# Altium schematic symbol library Regulator_Linear.SchLib: 1538 symbols (part 6 of 9)
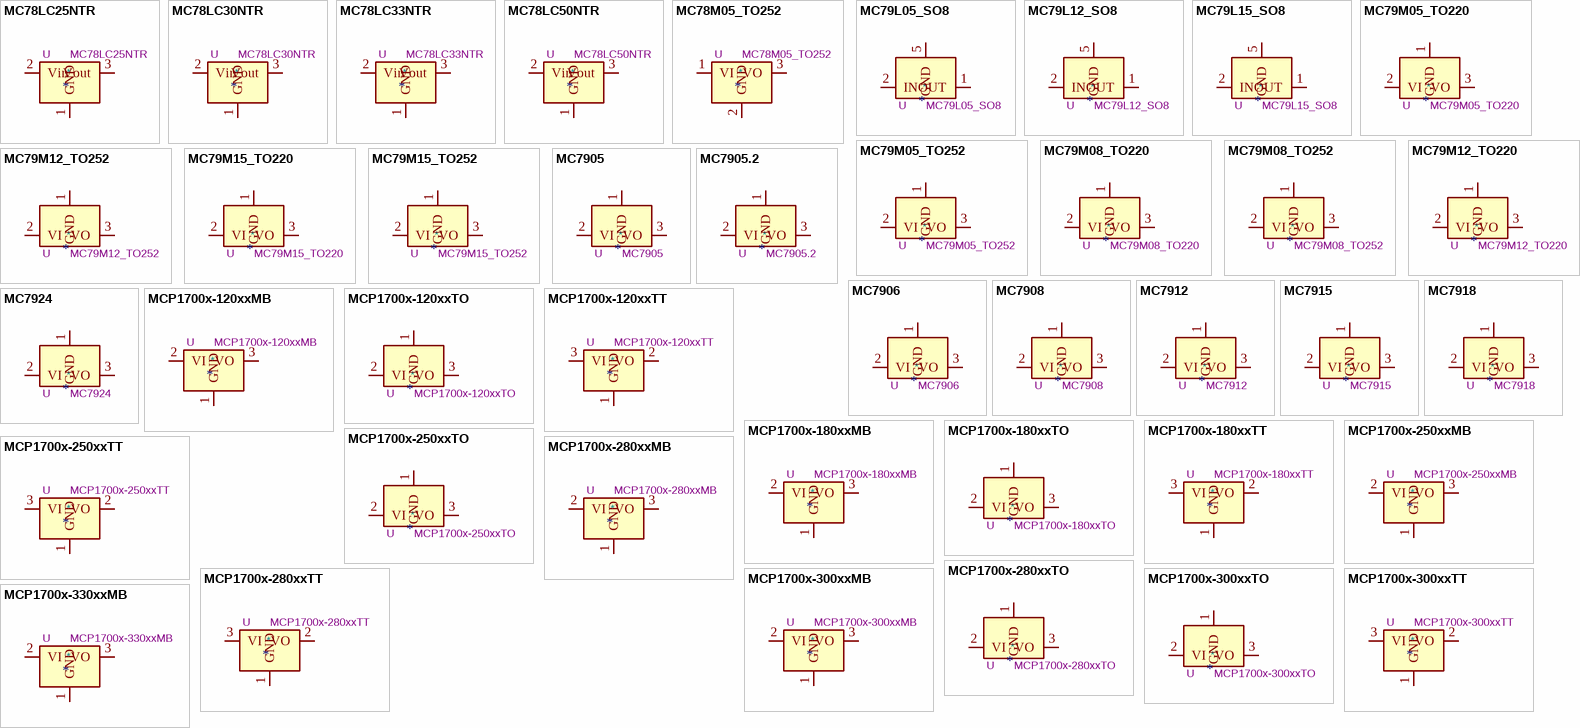
[diagram p43: symbols MC78LC25NTR to MCP1700x-330xxMB]

## MC79M15_TO220
designator *  value MC79M15_TO220  Reference: U
ki_keywords: Voltage Regulator 500mA Negative; ki_description: Negative 500mA 35V Linear Regulator, Fixed Output -15V, TO-220; ki_fp_filters: TO?220*; Footprint: Package_TO_SOT_THT:TO-220-3_Vertical; Datasheet: http://www.onsemi.com/pub/Collateral/MC79M00-D.PDF
pins: 1 GND, 2 VI, 3 VO

## MC79M15_TO252
designator *  value MC79M15_TO252  Reference: U
ki_keywords: Voltage Regulator 500mA Negative; ki_description: Negative 500mA 35V Linear Regulator, Fixed Output -15V, TO-252; ki_fp_filters: TO?252*; Footprint: Package_TO_SOT_SMD:TO-252-2; Datasheet: http://www.onsemi.com/pub/Collateral/MC79M00-D.PDF
pins: 1 GND, 2 VI, 3 VO

## MC7905
designator *  value MC7905  Reference: U
ki_keywords: Voltage Regulator 1.5A Negative; ki_description: Negative 1A 35V Linear Regulator, Fixed Output -5V, TO-220/TO-263; ki_fp_filters: TO?220* TO?263*; Datasheet: http://www.onsemi.com/pub/Collateral/MC7900-D.PDF
pins: 1 GND, 2 VI, 3 VO

## MC7905.2
designator *  value MC7905.2  Reference: U
ki_keywords: Voltage Regulator 1.5A Negative; ki_description: Negative 1A 35V Linear Regulator, Fixed Output -5.2V, TO-220/TO-263; ki_fp_filters: TO?220* TO?263*; Datasheet: http://www.onsemi.com/pub/Collateral/MC7900-D.PDF
pins: 1 GND, 2 VI, 3 VO

## MC7906
designator *  value MC7906  Reference: U
ki_keywords: Voltage Regulator 1.5A Negative; ki_description: Negative 1A 35V Linear Regulator, Fixed Output -6V, TO-220/TO-263; ki_fp_filters: TO?220* TO?263*; Datasheet: http://www.onsemi.com/pub/Collateral/MC7900-D.PDF
pins: 1 GND, 2 VI, 3 VO

## MC7908
designator *  value MC7908  Reference: U
ki_keywords: Voltage Regulator 1.5A Negative; ki_description: Negative 1A 35V Linear Regulator, Fixed Output -8V, TO-220/TO-263; ki_fp_filters: TO?220* TO?263*; Datasheet: http://www.onsemi.com/pub/Collateral/MC7900-D.PDF
pins: 1 GND, 2 VI, 3 VO

## MC7912
designator *  value MC7912  Reference: U
ki_keywords: Voltage Regulator 1.5A Negative; ki_description: Negative 1A 35V Linear Regulator, Fixed Output -12V, TO-220/TO-263; ki_fp_filters: TO?220* TO?263*; Datasheet: http://www.onsemi.com/pub/Collateral/MC7900-D.PDF
pins: 1 GND, 2 VI, 3 VO

## MC7915
designator *  value MC7915  Reference: U
ki_keywords: Voltage Regulator 1.5A Negative; ki_description: Negative 1A 35V Linear Regulator, Fixed Output -15V, TO-220/TO-263; ki_fp_filters: TO?220* TO?263*; Datasheet: http://www.onsemi.com/pub/Collateral/MC7900-D.PDF
pins: 1 GND, 2 VI, 3 VO

## MC7918
designator *  value MC7918  Reference: U
ki_keywords: Voltage Regulator 1.5A Negative; ki_description: Negative 1A 35V Linear Regulator, Fixed Output -18V, TO-220/TO-263; ki_fp_filters: TO?220* TO?263*; Datasheet: http://www.onsemi.com/pub/Collateral/MC7900-D.PDF
pins: 1 GND, 2 VI, 3 VO

## MC7924
designator *  value MC7924  Reference: U
ki_keywords: Voltage Regulator 1.5A Negative; ki_description: Negative 1A 40V Linear Regulator, Fixed Output -24V, TO-220/TO-263; ki_fp_filters: TO?220* TO?263*; Datasheet: http://www.onsemi.com/pub/Collateral/MC7900-D.PDF
pins: 1 GND, 2 VI, 3 VO

## MCP1700x-120xxMB
designator *  value MCP1700x-120xxMB  Reference: U
ki_keywords: regulator linear ldo; ki_description: 250mA Low Quiscent Current LDO, 1.2V output, SOT-89; ki_fp_filters: SOT?89*; Footprint: Package_TO_SOT_SMD:SOT-89-3; Datasheet: http://ww1.microchip.com/downloads/en/DeviceDoc/20001826D.pdf
pins: 1 GND, 2 VI, 3 VO

## MCP1700x-120xxTO
designator *  value MCP1700x-120xxTO  Reference: U
ki_keywords: regulator linear ldo; ki_description: 250mA Low Quiscent Current LDO, 1.2V output, TO-92; ki_fp_filters: TO?92*; Footprint: Package_TO_SOT_THT:TO-92_Inline; Datasheet: http://ww1.microchip.com/downloads/en/DeviceDoc/20001826D.pdf
pins: 1 GND, 2 VI, 3 VO

## MCP1700x-120xxTT
designator *  value MCP1700x-120xxTT  Reference: U
ki_keywords: regulator linear ldo; ki_description: 250mA Low Quiscent Current LDO, 1.2V output, SOT-23; ki_fp_filters: SOT?23*; Footprint: Package_TO_SOT_SMD:SOT-23; Datasheet: http://ww1.microchip.com/downloads/en/DeviceDoc/20001826D.pdf
pins: 1 GND, 2 VO, 3 VI

## MCP1700x-180xxMB
designator *  value MCP1700x-180xxMB  Reference: U
ki_keywords: regulator linear ldo; ki_description: 250mA Low Quiscent Current LDO, 1.8V output, SOT-89; ki_fp_filters: SOT?89*; Footprint: Package_TO_SOT_SMD:SOT-89-3; Datasheet: http://ww1.microchip.com/downloads/en/DeviceDoc/20001826D.pdf
pins: 1 GND, 2 VI, 3 VO

## MCP1700x-180xxTO
designator *  value MCP1700x-180xxTO  Reference: U
ki_keywords: regulator linear ldo; ki_description: 250mA Low Quiscent Current LDO, 1.8V output, TO-92; ki_fp_filters: TO?92*; Footprint: Package_TO_SOT_THT:TO-92_Inline; Datasheet: http://ww1.microchip.com/downloads/en/DeviceDoc/20001826D.pdf
pins: 1 GND, 2 VI, 3 VO

## MCP1700x-180xxTT
designator *  value MCP1700x-180xxTT  Reference: U
ki_keywords: regulator linear ldo; ki_description: 250mA Low Quiscent Current LDO, 1.8V output, SOT-23; ki_fp_filters: SOT?23*; Footprint: Package_TO_SOT_SMD:SOT-23; Datasheet: http://ww1.microchip.com/downloads/en/DeviceDoc/20001826D.pdf
pins: 1 GND, 2 VO, 3 VI

## MCP1700x-250xxMB
designator *  value MCP1700x-250xxMB  Reference: U
ki_keywords: regulator linear ldo; ki_description: 250mA Low Quiscent Current LDO, 2.5V output, SOT-89; ki_fp_filters: SOT?89*; Footprint: Package_TO_SOT_SMD:SOT-89-3; Datasheet: http://ww1.microchip.com/downloads/en/DeviceDoc/20001826D.pdf
pins: 1 GND, 2 VI, 3 VO

## MCP1700x-250xxTO
designator *  value MCP1700x-250xxTO  Reference: U
ki_keywords: regulator linear ldo; ki_description: 250mA Low Quiscent Current LDO, 2.5V output, TO-92; ki_fp_filters: TO?92*; Footprint: Package_TO_SOT_THT:TO-92_Inline; Datasheet: http://ww1.microchip.com/downloads/en/DeviceDoc/20001826D.pdf
pins: 1 GND, 2 VI, 3 VO

## MCP1700x-250xxTT
designator *  value MCP1700x-250xxTT  Reference: U
ki_keywords: regulator linear ldo; ki_description: 250mA Low Quiscent Current LDO, 2.5V output, SOT-23; ki_fp_filters: SOT?23*; Footprint: Package_TO_SOT_SMD:SOT-23; Datasheet: http://ww1.microchip.com/downloads/en/DeviceDoc/20001826D.pdf
pins: 1 GND, 2 VO, 3 VI

## MCP1700x-280xxMB
designator *  value MCP1700x-280xxMB  Reference: U
ki_keywords: regulator linear ldo; ki_description: 250mA Low Quiscent Current LDO, 2.8V output, SOT-89; ki_fp_filters: SOT?89*; Footprint: Package_TO_SOT_SMD:SOT-89-3; Datasheet: http://ww1.microchip.com/downloads/en/DeviceDoc/20001826D.pdf
pins: 1 GND, 2 VI, 3 VO

## MCP1700x-280xxTO
designator *  value MCP1700x-280xxTO  Reference: U
ki_keywords: regulator linear ldo; ki_description: 250mA Low Quiscent Current LDO, 2.8V output, TO-92; ki_fp_filters: TO?92*; Footprint: Package_TO_SOT_THT:TO-92_Inline; Datasheet: http://ww1.microchip.com/downloads/en/DeviceDoc/20001826D.pdf
pins: 1 GND, 2 VI, 3 VO

## MCP1700x-280xxTT
designator *  value MCP1700x-280xxTT  Reference: U
ki_keywords: regulator linear ldo; ki_description: 250mA Low Quiscent Current LDO, 2.8V output, SOT-23; ki_fp_filters: SOT?23*; Footprint: Package_TO_SOT_SMD:SOT-23; Datasheet: http://ww1.microchip.com/downloads/en/DeviceDoc/20001826D.pdf
pins: 1 GND, 2 VO, 3 VI

## MCP1700x-300xxMB
designator *  value MCP1700x-300xxMB  Reference: U
ki_keywords: regulator linear ldo; ki_description: 250mA Low Quiscent Current LDO, 3.0V output, SOT-89; ki_fp_filters: SOT?89*; Footprint: Package_TO_SOT_SMD:SOT-89-3; Datasheet: http://ww1.microchip.com/downloads/en/DeviceDoc/20001826D.pdf
pins: 1 GND, 2 VI, 3 VO

## MCP1700x-300xxTO
designator *  value MCP1700x-300xxTO  Reference: U
ki_keywords: regulator linear ldo; ki_description: 250mA Low Quiscent Current LDO, 3.0V output, TO-92; ki_fp_filters: TO?92*; Footprint: Package_TO_SOT_THT:TO-92_Inline; Datasheet: http://ww1.microchip.com/downloads/en/DeviceDoc/20001826D.pdf
pins: 1 GND, 2 VI, 3 VO

## MCP1700x-300xxTT
designator *  value MCP1700x-300xxTT  Reference: U
ki_keywords: regulator linear ldo; ki_description: 250mA Low Quiscent Current LDO, 3.0V output, SOT-23; ki_fp_filters: SOT?23*; Footprint: Package_TO_SOT_SMD:SOT-23; Datasheet: http://ww1.microchip.com/downloads/en/DeviceDoc/20001826D.pdf
pins: 1 GND, 2 VO, 3 VI

## MCP1700x-330xxMB
designator *  value MCP1700x-330xxMB  Reference: U
ki_keywords: regulator linear ldo; ki_description: 250mA Low Quiscent Current LDO, 3.3V output, SOT-89; ki_fp_filters: SOT?89*; Footprint: Package_TO_SOT_SMD:SOT-89-3; Datasheet: http://ww1.microchip.com/downloads/en/DeviceDoc/20001826D.pdf
pins: 1 GND, 2 VI, 3 VO

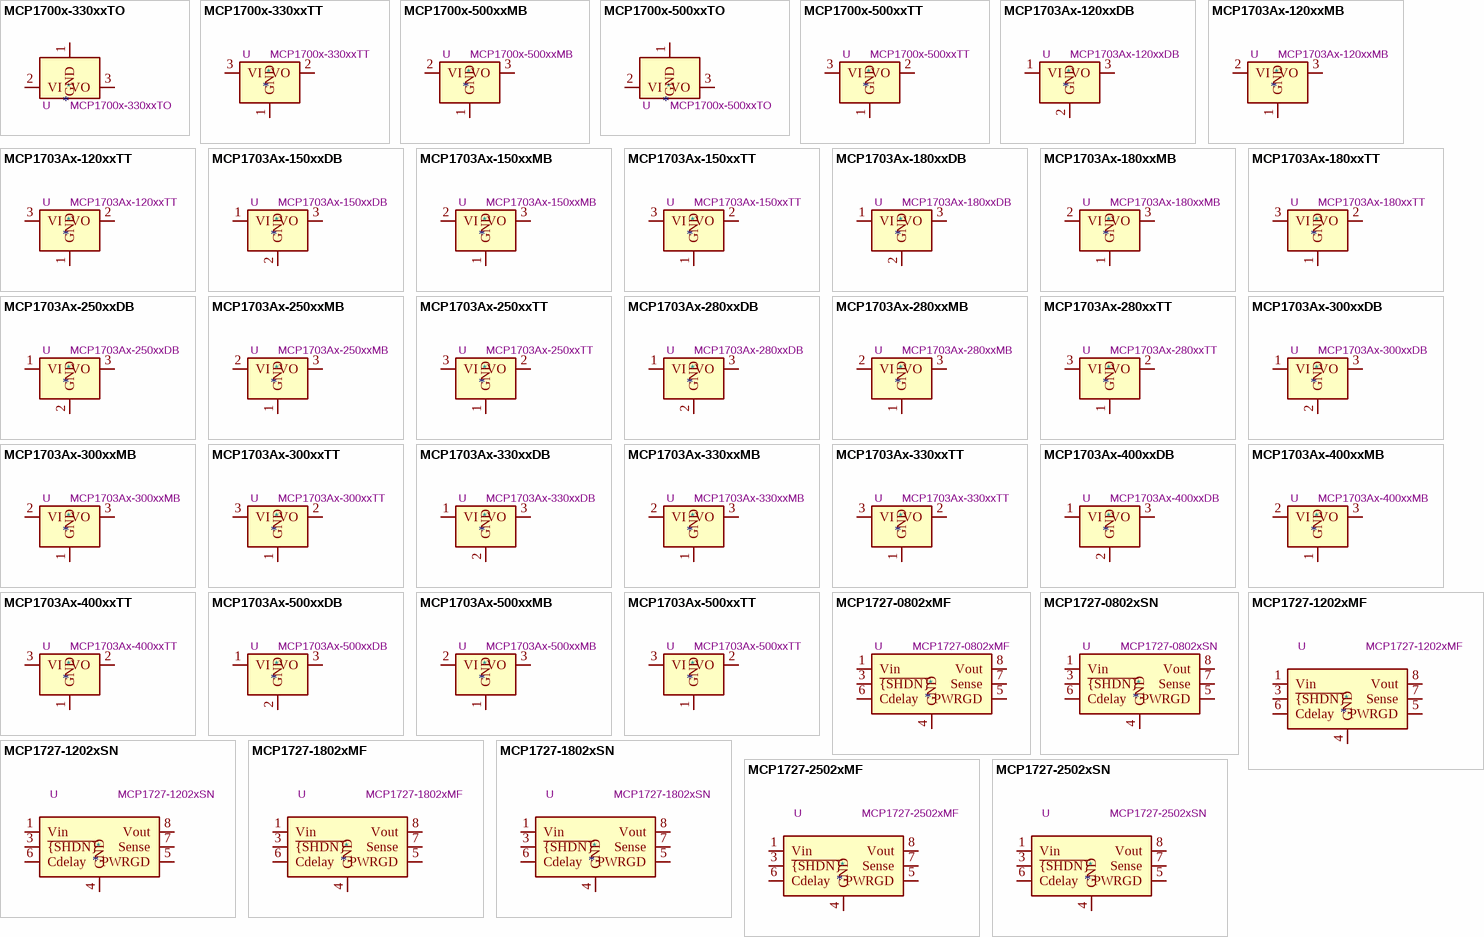
[diagram p23: symbols MCP1700x-330xxTO to MCP1727-2502xSN]

## MCP1700x-330xxTO
designator *  value MCP1700x-330xxTO  Reference: U
ki_keywords: regulator linear ldo; ki_description: 250mA Low Quiscent Current LDO, 3.3V output, TO-92; ki_fp_filters: TO?92*; Footprint: Package_TO_SOT_THT:TO-92_Inline; Datasheet: http://ww1.microchip.com/downloads/en/DeviceDoc/20001826D.pdf
pins: 1 GND, 2 VI, 3 VO

## MCP1700x-330xxTT
designator *  value MCP1700x-330xxTT  Reference: U
ki_keywords: regulator linear ldo; ki_description: 250mA Low Quiscent Current LDO, 3.3V output, SOT-23; ki_fp_filters: SOT?23*; Footprint: Package_TO_SOT_SMD:SOT-23; Datasheet: http://ww1.microchip.com/downloads/en/DeviceDoc/20001826D.pdf
pins: 1 GND, 2 VO, 3 VI

## MCP1700x-500xxMB
designator *  value MCP1700x-500xxMB  Reference: U
ki_keywords: regulator linear ldo; ki_description: 250mA Low Quiscent Current LDO, 5.0V output, SOT-89; ki_fp_filters: SOT?89*; Footprint: Package_TO_SOT_SMD:SOT-89-3; Datasheet: http://ww1.microchip.com/downloads/en/DeviceDoc/20001826D.pdf
pins: 1 GND, 2 VI, 3 VO

## MCP1700x-500xxTO
designator *  value MCP1700x-500xxTO  Reference: U
ki_keywords: regulator linear ldo; ki_description: 250mA Low Quiscent Current LDO, 5.0V output, TO-92; ki_fp_filters: TO?92*; Footprint: Package_TO_SOT_THT:TO-92_Inline; Datasheet: http://ww1.microchip.com/downloads/en/DeviceDoc/20001826D.pdf
pins: 1 GND, 2 VI, 3 VO

## MCP1700x-500xxTT
designator *  value MCP1700x-500xxTT  Reference: U
ki_keywords: regulator linear ldo; ki_description: 250mA Low Quiscent Current LDO, 5.0V output, SOT-23; ki_fp_filters: SOT?23*; Footprint: Package_TO_SOT_SMD:SOT-23; Datasheet: http://ww1.microchip.com/downloads/en/DeviceDoc/20001826D.pdf
pins: 1 GND, 2 VO, 3 VI

## MCP1703Ax-120xxDB
designator *  value MCP1703Ax-120xxDB  Reference: U
ki_keywords: REGULATOR LDO; ki_description: Low Quiescent Current LDO Regulator, 1.2V, 250mA, Vin<=16V, SOT-223; ki_fp_filters: SOT?223*TabPin2*; Footprint: Package_TO_SOT_SMD:SOT-223-3_TabPin2; Datasheet: http://ww1.microchip.com/downloads/en/DeviceDoc/20005122B.pdf
pins: 1 VI, 2 GND, 3 VO

## MCP1703Ax-120xxMB
designator *  value MCP1703Ax-120xxMB  Reference: U
ki_keywords: REGULATOR LDO; ki_description: Low Quiescent Current LDO Regulator, 1.2V, 250mA, Vin<=16V, SOT-89; ki_fp_filters: SOT?89*; Footprint: Package_TO_SOT_SMD:SOT-89-3; Datasheet: http://ww1.microchip.com/downloads/en/DeviceDoc/20005122B.pdf
pins: 1 GND, 2 VI, 3 VO

## MCP1703Ax-120xxTT
designator *  value MCP1703Ax-120xxTT  Reference: U
ki_keywords: REGULATOR LDO; ki_description: Low Quiescent Current LDO Regulator, 1.2V, 250mA, Vin<=16V, SOT-23; ki_fp_filters: SOT?23*; Footprint: Package_TO_SOT_SMD:SOT-23; Datasheet: http://ww1.microchip.com/downloads/en/DeviceDoc/20005122B.pdf
pins: 1 GND, 2 VO, 3 VI

## MCP1703Ax-150xxDB
designator *  value MCP1703Ax-150xxDB  Reference: U
ki_keywords: REGULATOR LDO; ki_description: Low Quiescent Current LDO Regulator, 1.5V, 250mA, Vin<=16V, SOT-223; ki_fp_filters: SOT?223*TabPin2*; Footprint: Package_TO_SOT_SMD:SOT-223-3_TabPin2; Datasheet: http://ww1.microchip.com/downloads/en/DeviceDoc/20005122B.pdf
pins: 1 VI, 2 GND, 3 VO

## MCP1703Ax-150xxMB
designator *  value MCP1703Ax-150xxMB  Reference: U
ki_keywords: REGULATOR LDO; ki_description: Low Quiescent Current LDO Regulator, 1.5V, 250mA, Vin<=16V, SOT-89; ki_fp_filters: SOT?89*; Footprint: Package_TO_SOT_SMD:SOT-89-3; Datasheet: http://ww1.microchip.com/downloads/en/DeviceDoc/20005122B.pdf
pins: 1 GND, 2 VI, 3 VO

## MCP1703Ax-150xxTT
designator *  value MCP1703Ax-150xxTT  Reference: U
ki_keywords: REGULATOR LDO; ki_description: Low Quiescent Current LDO Regulator, 1.5V, 250mA, Vin<=16V, SOT-23; ki_fp_filters: SOT?23*; Footprint: Package_TO_SOT_SMD:SOT-23; Datasheet: http://ww1.microchip.com/downloads/en/DeviceDoc/20005122B.pdf
pins: 1 GND, 2 VO, 3 VI

## MCP1703Ax-180xxDB
designator *  value MCP1703Ax-180xxDB  Reference: U
ki_keywords: REGULATOR LDO; ki_description: Low Quiescent Current LDO Regulator, 1.8V, 250mA, Vin<=16V, SOT-223; ki_fp_filters: SOT?223*TabPin2*; Footprint: Package_TO_SOT_SMD:SOT-223-3_TabPin2; Datasheet: http://ww1.microchip.com/downloads/en/DeviceDoc/20005122B.pdf
pins: 1 VI, 2 GND, 3 VO

## MCP1703Ax-180xxMB
designator *  value MCP1703Ax-180xxMB  Reference: U
ki_keywords: REGULATOR LDO; ki_description: Low Quiescent Current LDO Regulator, 1.8V, 250mA, Vin<=16V, SOT-89; ki_fp_filters: SOT?89*; Footprint: Package_TO_SOT_SMD:SOT-89-3; Datasheet: http://ww1.microchip.com/downloads/en/DeviceDoc/20005122B.pdf
pins: 1 GND, 2 VI, 3 VO

## MCP1703Ax-180xxTT
designator *  value MCP1703Ax-180xxTT  Reference: U
ki_keywords: REGULATOR LDO; ki_description: Low Quiescent Current LDO Regulator, 1.8V, 250mA, Vin<=16V, SOT-23; ki_fp_filters: SOT?23*; Footprint: Package_TO_SOT_SMD:SOT-23; Datasheet: http://ww1.microchip.com/downloads/en/DeviceDoc/20005122B.pdf
pins: 1 GND, 2 VO, 3 VI

## MCP1703Ax-250xxDB
designator *  value MCP1703Ax-250xxDB  Reference: U
ki_keywords: REGULATOR LDO; ki_description: Low Quiescent Current LDO Regulator, 2.5V, 250mA, Vin<=16V, SOT-223; ki_fp_filters: SOT?223*TabPin2*; Footprint: Package_TO_SOT_SMD:SOT-223-3_TabPin2; Datasheet: http://ww1.microchip.com/downloads/en/DeviceDoc/20005122B.pdf
pins: 1 VI, 2 GND, 3 VO

## MCP1703Ax-250xxMB
designator *  value MCP1703Ax-250xxMB  Reference: U
ki_keywords: REGULATOR LDO; ki_description: Low Quiescent Current LDO Regulator, 2.5V, 250mA, Vin<=16V, SOT-89; ki_fp_filters: SOT?89*; Footprint: Package_TO_SOT_SMD:SOT-89-3; Datasheet: http://ww1.microchip.com/downloads/en/DeviceDoc/20005122B.pdf
pins: 1 GND, 2 VI, 3 VO

## MCP1703Ax-250xxTT
designator *  value MCP1703Ax-250xxTT  Reference: U
ki_keywords: REGULATOR LDO; ki_description: Low Quiescent Current LDO Regulator, 2.5V, 250mA, Vin<=16V, SOT-23; ki_fp_filters: SOT?23*; Footprint: Package_TO_SOT_SMD:SOT-23; Datasheet: http://ww1.microchip.com/downloads/en/DeviceDoc/20005122B.pdf
pins: 1 GND, 2 VO, 3 VI

## MCP1703Ax-280xxDB
designator *  value MCP1703Ax-280xxDB  Reference: U
ki_keywords: REGULATOR LDO; ki_description: Low Quiescent Current LDO Regulator, 2.8V, 250mA, Vin<=16V, SOT-223; ki_fp_filters: SOT?223*TabPin2*; Footprint: Package_TO_SOT_SMD:SOT-223-3_TabPin2; Datasheet: http://ww1.microchip.com/downloads/en/DeviceDoc/20005122B.pdf
pins: 1 VI, 2 GND, 3 VO

## MCP1703Ax-280xxMB
designator *  value MCP1703Ax-280xxMB  Reference: U
ki_keywords: REGULATOR LDO; ki_description: Low Quiescent Current LDO Regulator, 2.8V, 250mA, Vin<=16V, SOT-89; ki_fp_filters: SOT?89*; Footprint: Package_TO_SOT_SMD:SOT-89-3; Datasheet: http://ww1.microchip.com/downloads/en/DeviceDoc/20005122B.pdf
pins: 1 GND, 2 VI, 3 VO

## MCP1703Ax-280xxTT
designator *  value MCP1703Ax-280xxTT  Reference: U
ki_keywords: REGULATOR LDO; ki_description: Low Quiescent Current LDO Regulator, 2.8V, 250mA, Vin<=16V, SOT-23; ki_fp_filters: SOT?23*; Footprint: Package_TO_SOT_SMD:SOT-23; Datasheet: http://ww1.microchip.com/downloads/en/DeviceDoc/20005122B.pdf
pins: 1 GND, 2 VO, 3 VI

## MCP1703Ax-300xxDB
designator *  value MCP1703Ax-300xxDB  Reference: U
ki_keywords: REGULATOR LDO; ki_description: Low Quiescent Current LDO Regulator, 3.0V, 250mA, Vin<=16V, SOT-223; ki_fp_filters: SOT?223*TabPin2*; Footprint: Package_TO_SOT_SMD:SOT-223-3_TabPin2; Datasheet: http://ww1.microchip.com/downloads/en/DeviceDoc/20005122B.pdf
pins: 1 VI, 2 GND, 3 VO

## MCP1703Ax-300xxMB
designator *  value MCP1703Ax-300xxMB  Reference: U
ki_keywords: REGULATOR LDO; ki_description: Low Quiescent Current LDO Regulator, 3.0V, 250mA, Vin<=16V, SOT-89; ki_fp_filters: SOT?89*; Footprint: Package_TO_SOT_SMD:SOT-89-3; Datasheet: http://ww1.microchip.com/downloads/en/DeviceDoc/20005122B.pdf
pins: 1 GND, 2 VI, 3 VO

## MCP1703Ax-300xxTT
designator *  value MCP1703Ax-300xxTT  Reference: U
ki_keywords: REGULATOR LDO; ki_description: Low Quiescent Current LDO Regulator, 3.0V, 250mA, Vin<=16V, SOT-23; ki_fp_filters: SOT?23*; Footprint: Package_TO_SOT_SMD:SOT-23; Datasheet: http://ww1.microchip.com/downloads/en/DeviceDoc/20005122B.pdf
pins: 1 GND, 2 VO, 3 VI

## MCP1703Ax-330xxDB
designator *  value MCP1703Ax-330xxDB  Reference: U
ki_keywords: REGULATOR LDO; ki_description: Low Quiescent Current LDO Regulator, 3.3V, 250mA, Vin<=16V, SOT-223; ki_fp_filters: SOT?223*TabPin2*; Footprint: Package_TO_SOT_SMD:SOT-223-3_TabPin2; Datasheet: http://ww1.microchip.com/downloads/en/DeviceDoc/20005122B.pdf
pins: 1 VI, 2 GND, 3 VO

## MCP1703Ax-330xxMB
designator *  value MCP1703Ax-330xxMB  Reference: U
ki_keywords: REGULATOR LDO; ki_description: Low Quiescent Current LDO Regulator, 3.3V, 250mA, Vin<=16V, SOT-89; ki_fp_filters: SOT?89*; Footprint: Package_TO_SOT_SMD:SOT-89-3; Datasheet: http://ww1.microchip.com/downloads/en/DeviceDoc/20005122B.pdf
pins: 1 GND, 2 VI, 3 VO

## MCP1703Ax-330xxTT
designator *  value MCP1703Ax-330xxTT  Reference: U
ki_keywords: REGULATOR LDO; ki_description: Low Quiescent Current LDO Regulator, 3.3V, 250mA, Vin<=16V, SOT-23; ki_fp_filters: SOT?23*; Footprint: Package_TO_SOT_SMD:SOT-23; Datasheet: http://ww1.microchip.com/downloads/en/DeviceDoc/20005122B.pdf
pins: 1 GND, 2 VO, 3 VI

## MCP1703Ax-400xxDB
designator *  value MCP1703Ax-400xxDB  Reference: U
ki_keywords: REGULATOR LDO; ki_description: Low Quiescent Current LDO Regulator, 4.0V, 250mA, Vin<=16V, SOT-223; ki_fp_filters: SOT?223*TabPin2*; Footprint: Package_TO_SOT_SMD:SOT-223-3_TabPin2; Datasheet: http://ww1.microchip.com/downloads/en/DeviceDoc/20005122B.pdf
pins: 1 VI, 2 GND, 3 VO

## MCP1703Ax-400xxMB
designator *  value MCP1703Ax-400xxMB  Reference: U
ki_keywords: REGULATOR LDO; ki_description: Low Quiescent Current LDO Regulator, 4.0V, 250mA, Vin<=16V, SOT-89; ki_fp_filters: SOT?89*; Footprint: Package_TO_SOT_SMD:SOT-89-3; Datasheet: http://ww1.microchip.com/downloads/en/DeviceDoc/20005122B.pdf
pins: 1 GND, 2 VI, 3 VO

## MCP1703Ax-400xxTT
designator *  value MCP1703Ax-400xxTT  Reference: U
ki_keywords: REGULATOR LDO; ki_description: Low Quiescent Current LDO Regulator, 4.0V, 250mA, Vin<=16V, SOT-23; ki_fp_filters: SOT?23*; Footprint: Package_TO_SOT_SMD:SOT-23; Datasheet: http://ww1.microchip.com/downloads/en/DeviceDoc/20005122B.pdf
pins: 1 GND, 2 VO, 3 VI

## MCP1703Ax-500xxDB
designator *  value MCP1703Ax-500xxDB  Reference: U
ki_keywords: REGULATOR LDO; ki_description: Low Quiescent Current LDO Regulator, 5.0V, 250mA, Vin<=16V, SOT-223; ki_fp_filters: SOT?223*TabPin2*; Footprint: Package_TO_SOT_SMD:SOT-223-3_TabPin2; Datasheet: http://ww1.microchip.com/downloads/en/DeviceDoc/20005122B.pdf
pins: 1 VI, 2 GND, 3 VO

## MCP1703Ax-500xxMB
designator *  value MCP1703Ax-500xxMB  Reference: U
ki_keywords: REGULATOR LDO; ki_description: Low Quiescent Current LDO Regulator, 5.0V, 250mA, Vin<=16V, SOT-89; ki_fp_filters: SOT?89*; Footprint: Package_TO_SOT_SMD:SOT-89-3; Datasheet: http://ww1.microchip.com/downloads/en/DeviceDoc/20005122B.pdf
pins: 1 GND, 2 VI, 3 VO

## MCP1703Ax-500xxTT
designator *  value MCP1703Ax-500xxTT  Reference: U
ki_keywords: REGULATOR LDO; ki_description: Low Quiescent Current LDO Regulator, 5.0V, 250mA, Vin<=16V, SOT-23; ki_fp_filters: SOT?23*; Footprint: Package_TO_SOT_SMD:SOT-23; Datasheet: http://ww1.microchip.com/downloads/en/DeviceDoc/20005122B.pdf
pins: 1 GND, 2 VO, 3 VI

## MCP1727-0802xMF
designator *  value MCP1727-0802xMF  Reference: U
ki_keywords: Low Voltage Low Quiescent Current Fixed LDO Regulator; ki_description: 1.5A, Low Voltage, Low Quiescent Current LDO Regulator, 2.3 - 6V Input, Fixed 0.8V Output, 330mV Dropout, DFN-8; ki_fp_filters: DFN*3x3mm*P0.65mm*; Footprint: Package_DFN_QFN:DFN-8-1EP_3x3mm_P0.65mm_EP1.55x2.4mm; Datasheet: https://ww1.microchip.com/downloads/aemtest/APID/ProductDocuments/DataSheets/MCP1727-1.5A-Low-Voltage-Low-Quiescent-Current-LDO-Regulator-20001999D.pdf
pins: 1 Vin, 2 Vin hidden, 3 ~{{SHDN}}, 4 GND, 5 PWRGD, 6 Cdelay, 7 Sense, 8 Vout, 9 GND hidden

## MCP1727-0802xSN
designator *  value MCP1727-0802xSN  Reference: U
ki_keywords: Low Voltage Low Quiescent Current Fixed LDO Regulator; ki_description: 1.5A, Low Voltage, Low Quiescent Current LDO Regulator, 2.3 - 6V Input, Fixed 0.8V Output, 330mV Dropout, SOIC-8; ki_fp_filters: SOIC*3.9x4.9mm*P1.27mm*; Footprint: Package_SO:SOIC-8_3.9x4.9mm_P1.27mm; Datasheet: https://ww1.microchip.com/downloads/aemtest/APID/ProductDocuments/DataSheets/MCP1727-1.5A-Low-Voltage-Low-Quiescent-Current-LDO-Regulator-20001999D.pdf
pins: 1 Vin, 2 Vin hidden, 3 ~{{SHDN}}, 4 GND, 5 PWRGD, 6 Cdelay, 7 Sense, 8 Vout

## MCP1727-1202xMF
designator *  value MCP1727-1202xMF  Reference: U
ki_keywords: Low Voltage Low Quiescent Current Fixed LDO Regulator; ki_description: 1.5A, Low Voltage, Low Quiescent Current LDO Regulator, 2.3 - 6V Input, Fixed 1.2V Output, 330mV Dropout, DFN-8; ki_fp_filters: DFN*3x3mm*P0.65mm*; Footprint: Package_DFN_QFN:DFN-8-1EP_3x3mm_P0.65mm_EP1.55x2.4mm; Datasheet: https://ww1.microchip.com/downloads/aemtest/APID/ProductDocuments/DataSheets/MCP1727-1.5A-Low-Voltage-Low-Quiescent-Current-LDO-Regulator-20001999D.pdf
pins: 1 Vin, 2 Vin hidden, 3 ~{{SHDN}}, 4 GND, 5 PWRGD, 6 Cdelay, 7 Sense, 8 Vout, 9 GND hidden

## MCP1727-1202xSN
designator *  value MCP1727-1202xSN  Reference: U
ki_keywords: Low Voltage Low Quiescent Current Fixed LDO Regulator; ki_description: 1.5A, Low Voltage, Low Quiescent Current LDO Regulator, 2.3 - 6V Input, Fixed 1.2V Output, 330mV Dropout, SOIC-8; ki_fp_filters: SOIC*3.9x4.9mm*P1.27mm*; Footprint: Package_SO:SOIC-8_3.9x4.9mm_P1.27mm; Datasheet: https://ww1.microchip.com/downloads/aemtest/APID/ProductDocuments/DataSheets/MCP1727-1.5A-Low-Voltage-Low-Quiescent-Current-LDO-Regulator-20001999D.pdf
pins: 1 Vin, 2 Vin hidden, 3 ~{{SHDN}}, 4 GND, 5 PWRGD, 6 Cdelay, 7 Sense, 8 Vout

## MCP1727-1802xMF
designator *  value MCP1727-1802xMF  Reference: U
ki_keywords: Low Voltage Low Quiescent Current Fixed LDO Regulator; ki_description: 1.5A, Low Voltage, Low Quiescent Current LDO Regulator, 2.3 - 6V Input, Fixed 1.8V Output, 330mV Dropout, DFN-8; ki_fp_filters: DFN*3x3mm*P0.65mm*; Footprint: Package_DFN_QFN:DFN-8-1EP_3x3mm_P0.65mm_EP1.55x2.4mm; Datasheet: https://ww1.microchip.com/downloads/aemtest/APID/ProductDocuments/DataSheets/MCP1727-1.5A-Low-Voltage-Low-Quiescent-Current-LDO-Regulator-20001999D.pdf
pins: 1 Vin, 2 Vin hidden, 3 ~{{SHDN}}, 4 GND, 5 PWRGD, 6 Cdelay, 7 Sense, 8 Vout, 9 GND hidden

## MCP1727-1802xSN
designator *  value MCP1727-1802xSN  Reference: U
ki_keywords: Low Voltage Low Quiescent Current Fixed LDO Regulator; ki_description: 1.5A, Low Voltage, Low Quiescent Current LDO Regulator, 2.3 - 6V Input, Fixed 1.8V Output, 330mV Dropout, SOIC-8; ki_fp_filters: SOIC*3.9x4.9mm*P1.27mm*; Footprint: Package_SO:SOIC-8_3.9x4.9mm_P1.27mm; Datasheet: https://ww1.microchip.com/downloads/aemtest/APID/ProductDocuments/DataSheets/MCP1727-1.5A-Low-Voltage-Low-Quiescent-Current-LDO-Regulator-20001999D.pdf
pins: 1 Vin, 2 Vin hidden, 3 ~{{SHDN}}, 4 GND, 5 PWRGD, 6 Cdelay, 7 Sense, 8 Vout

## MCP1727-2502xMF
designator *  value MCP1727-2502xMF  Reference: U
ki_keywords: Low Voltage Low Quiescent Current Fixed LDO Regulator; ki_description: 1.5A, Low Voltage, Low Quiescent Current LDO Regulator, 2.3 - 6V Input, Fixed 2.5V Output, 330mV Dropout, DFN-8; ki_fp_filters: DFN*3x3mm*P0.65mm*; Footprint: Package_DFN_QFN:DFN-8-1EP_3x3mm_P0.65mm_EP1.55x2.4mm; Datasheet: https://ww1.microchip.com/downloads/aemtest/APID/ProductDocuments/DataSheets/MCP1727-1.5A-Low-Voltage-Low-Quiescent-Current-LDO-Regulator-20001999D.pdf
pins: 1 Vin, 2 Vin hidden, 3 ~{{SHDN}}, 4 GND, 5 PWRGD, 6 Cdelay, 7 Sense, 8 Vout, 9 GND hidden

## MCP1727-2502xSN
designator *  value MCP1727-2502xSN  Reference: U
ki_keywords: Low Voltage Low Quiescent Current Fixed LDO Regulator; ki_description: 1.5A, Low Voltage, Low Quiescent Current LDO Regulator, 2.3 - 6V Input, Fixed 2.5V Output, 330mV Dropout, SOIC-8; ki_fp_filters: SOIC*3.9x4.9mm*P1.27mm*; Footprint: Package_SO:SOIC-8_3.9x4.9mm_P1.27mm; Datasheet: https://ww1.microchip.com/downloads/aemtest/APID/ProductDocuments/DataSheets/MCP1727-1.5A-Low-Voltage-Low-Quiescent-Current-LDO-Regulator-20001999D.pdf
pins: 1 Vin, 2 Vin hidden, 3 ~{{SHDN}}, 4 GND, 5 PWRGD, 6 Cdelay, 7 Sense, 8 Vout

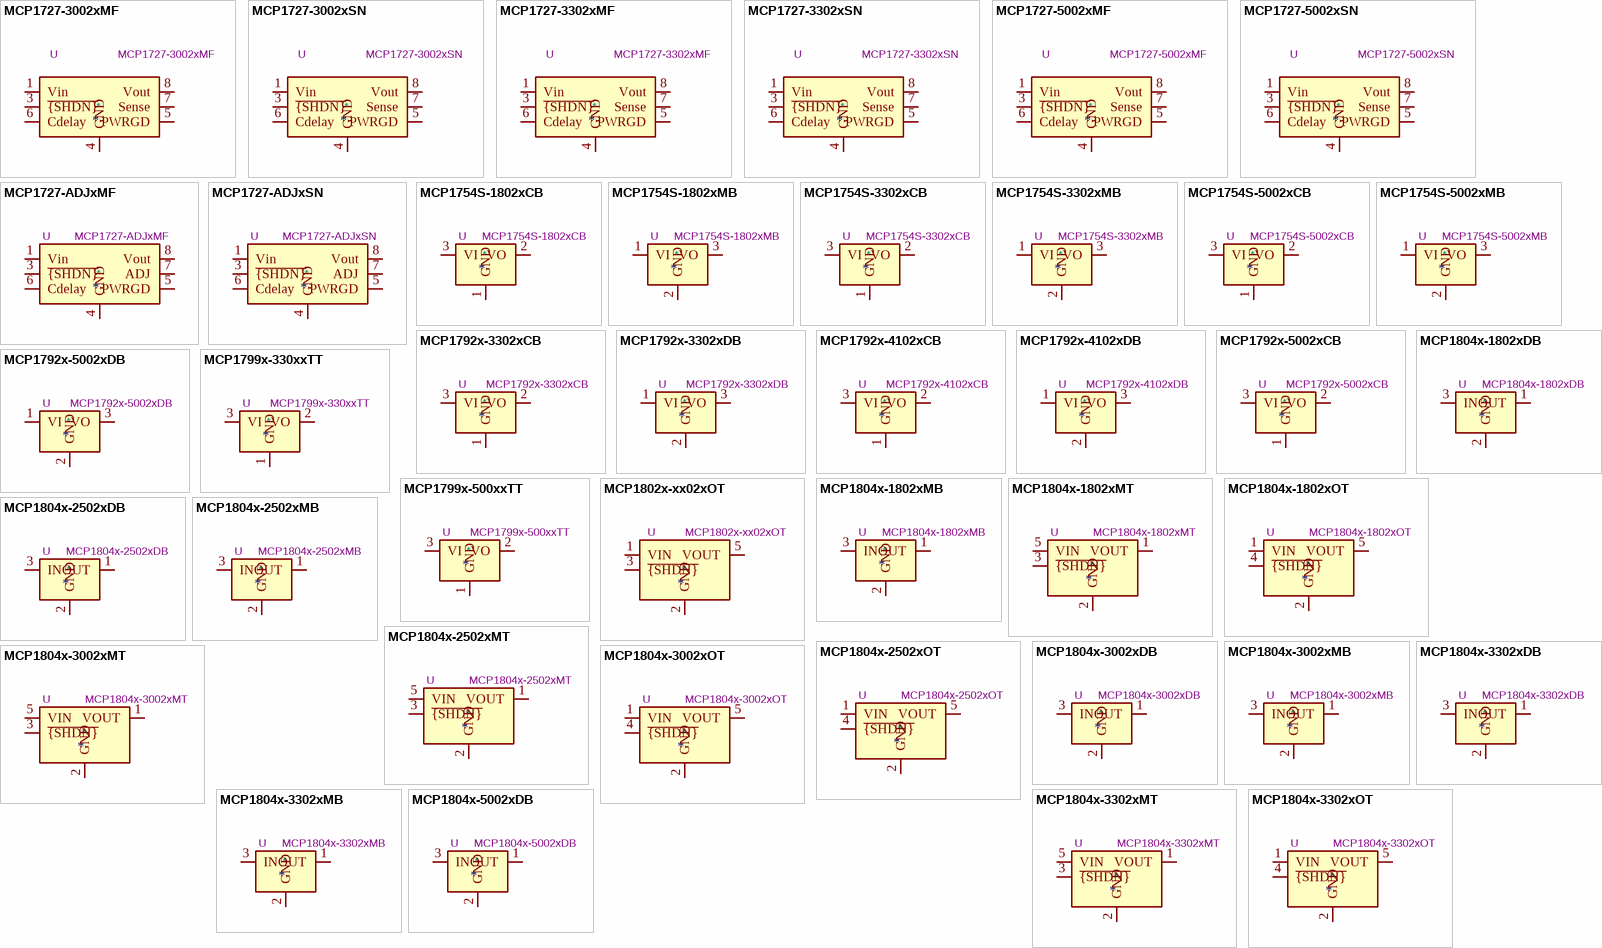
[diagram p24: symbols MCP1727-3002xMF to MCP1804x-5002xDB]

## MCP1727-3002xMF
designator *  value MCP1727-3002xMF  Reference: U
ki_keywords: Low Voltage Low Quiescent Current Fixed LDO Regulator; ki_description: 1.5A, Low Voltage, Low Quiescent Current LDO Regulator, 2.3 - 6V Input, Fixed 3.0V Output, 330mV Dropout, DFN-8; ki_fp_filters: DFN*3x3mm*P0.65mm*; Footprint: Package_DFN_QFN:DFN-8-1EP_3x3mm_P0.65mm_EP1.55x2.4mm; Datasheet: https://ww1.microchip.com/downloads/aemtest/APID/ProductDocuments/DataSheets/MCP1727-1.5A-Low-Voltage-Low-Quiescent-Current-LDO-Regulator-20001999D.pdf
pins: 1 Vin, 2 Vin hidden, 3 ~{{SHDN}}, 4 GND, 5 PWRGD, 6 Cdelay, 7 Sense, 8 Vout, 9 GND hidden

## MCP1727-3002xSN
designator *  value MCP1727-3002xSN  Reference: U
ki_keywords: Low Voltage Low Quiescent Current Fixed LDO Regulator; ki_description: 1.5A, Low Voltage, Low Quiescent Current LDO Regulator, 2.3 - 6V Input, Fixed 3.0V Output, 330mV Dropout, SOIC-8; ki_fp_filters: SOIC*3.9x4.9mm*P1.27mm*; Footprint: Package_SO:SOIC-8_3.9x4.9mm_P1.27mm; Datasheet: https://ww1.microchip.com/downloads/aemtest/APID/ProductDocuments/DataSheets/MCP1727-1.5A-Low-Voltage-Low-Quiescent-Current-LDO-Regulator-20001999D.pdf
pins: 1 Vin, 2 Vin hidden, 3 ~{{SHDN}}, 4 GND, 5 PWRGD, 6 Cdelay, 7 Sense, 8 Vout

## MCP1727-3302xMF
designator *  value MCP1727-3302xMF  Reference: U
ki_keywords: Low Voltage Low Quiescent Current Fixed LDO Regulator; ki_description: 1.5A, Low Voltage, Low Quiescent Current LDO Regulator, 2.3 - 6V Input, Fixed 3.3V Output, 330mV Dropout, DFN-8; ki_fp_filters: DFN*3x3mm*P0.65mm*; Footprint: Package_DFN_QFN:DFN-8-1EP_3x3mm_P0.65mm_EP1.55x2.4mm; Datasheet: https://ww1.microchip.com/downloads/aemtest/APID/ProductDocuments/DataSheets/MCP1727-1.5A-Low-Voltage-Low-Quiescent-Current-LDO-Regulator-20001999D.pdf
pins: 1 Vin, 2 Vin hidden, 3 ~{{SHDN}}, 4 GND, 5 PWRGD, 6 Cdelay, 7 Sense, 8 Vout, 9 GND hidden

## MCP1727-3302xSN
designator *  value MCP1727-3302xSN  Reference: U
ki_keywords: Low Voltage Low Quiescent Current Fixed LDO Regulator; ki_description: 1.5A, Low Voltage, Low Quiescent Current LDO Regulator, 2.3 - 6V Input, Fixed 3.3V Output, 330mV Dropout, SOIC-8; ki_fp_filters: SOIC*3.9x4.9mm*P1.27mm*; Footprint: Package_SO:SOIC-8_3.9x4.9mm_P1.27mm; Datasheet: https://ww1.microchip.com/downloads/aemtest/APID/ProductDocuments/DataSheets/MCP1727-1.5A-Low-Voltage-Low-Quiescent-Current-LDO-Regulator-20001999D.pdf
pins: 1 Vin, 2 Vin hidden, 3 ~{{SHDN}}, 4 GND, 5 PWRGD, 6 Cdelay, 7 Sense, 8 Vout

## MCP1727-5002xMF
designator *  value MCP1727-5002xMF  Reference: U
ki_keywords: Low Voltage Low Quiescent Current Fixed LDO Regulator; ki_description: 1.5A, Low Voltage, Low Quiescent Current LDO Regulator, 2.3 - 6V Input, Fixed 5.0V Output, 330mV Dropout, DFN-8; ki_fp_filters: DFN*3x3mm*P0.65mm*; Footprint: Package_DFN_QFN:DFN-8-1EP_3x3mm_P0.65mm_EP1.55x2.4mm; Datasheet: https://ww1.microchip.com/downloads/aemtest/APID/ProductDocuments/DataSheets/MCP1727-1.5A-Low-Voltage-Low-Quiescent-Current-LDO-Regulator-20001999D.pdf
pins: 1 Vin, 2 Vin hidden, 3 ~{{SHDN}}, 4 GND, 5 PWRGD, 6 Cdelay, 7 Sense, 8 Vout, 9 GND hidden

## MCP1727-5002xSN
designator *  value MCP1727-5002xSN  Reference: U
ki_keywords: Low Voltage Low Quiescent Current Fixed LDO Regulator; ki_description: 1.5A, Low Voltage, Low Quiescent Current LDO Regulator, 2.3 - 6V Input, Fixed 5.0V Output, 330mV Dropout, SOIC-8; ki_fp_filters: SOIC*3.9x4.9mm*P1.27mm*; Footprint: Package_SO:SOIC-8_3.9x4.9mm_P1.27mm; Datasheet: https://ww1.microchip.com/downloads/aemtest/APID/ProductDocuments/DataSheets/MCP1727-1.5A-Low-Voltage-Low-Quiescent-Current-LDO-Regulator-20001999D.pdf
pins: 1 Vin, 2 Vin hidden, 3 ~{{SHDN}}, 4 GND, 5 PWRGD, 6 Cdelay, 7 Sense, 8 Vout

## MCP1727-ADJxMF
designator *  value MCP1727-ADJxMF  Reference: U
ki_keywords: Low Voltage Low Quiescent Current Adjustable LDO Regulator; ki_description: 1.5A, Low Voltage, Low Quiescent Current LDO Regulator, 2.3 - 6V Input, Adjustable Output, 330mV Dropout, DFN-8; ki_fp_filters: DFN*3x3mm*P0.65mm*; Footprint: Package_DFN_QFN:DFN-8-1EP_3x3mm_P0.65mm_EP1.55x2.4mm; Datasheet: https://ww1.microchip.com/downloads/aemtest/APID/ProductDocuments/DataSheets/MCP1727-1.5A-Low-Voltage-Low-Quiescent-Current-LDO-Regulator-20001999D.pdf
pins: 1 Vin, 2 Vin hidden, 3 ~{{SHDN}}, 4 GND, 5 PWRGD, 6 Cdelay, 7 ADJ, 8 Vout, 9 GND hidden

## MCP1727-ADJxSN
designator *  value MCP1727-ADJxSN  Reference: U
ki_keywords: Low Voltage Low Quiescent Current Adjustable LDO Regulator; ki_description: 1.5A, Low Voltage, Low Quiescent Current LDO Regulator, 2.3 - 6V Input, Adjustable Output, 330mV Dropout, SOIC-8; ki_fp_filters: SOIC*3.9x4.9mm*P1.27mm*; Footprint: Package_SO:SOIC-8_3.9x4.9mm_P1.27mm; Datasheet: https://ww1.microchip.com/downloads/aemtest/APID/ProductDocuments/DataSheets/MCP1727-1.5A-Low-Voltage-Low-Quiescent-Current-LDO-Regulator-20001999D.pdf
pins: 1 Vin, 2 Vin hidden, 3 ~{{SHDN}}, 4 GND, 5 PWRGD, 6 Cdelay, 7 ADJ, 8 Vout

## MCP1754S-1802xCB
designator *  value MCP1754S-1802xCB  Reference: U
ki_keywords: Regulator LDO; ki_description: Fixed 150mA Low Dropout Voltage Regulator, Positive, 1.8V output, SOT-23; ki_fp_filters: SOT?23*; Footprint: Package_TO_SOT_SMD:SOT-23; Datasheet: http://ww1.microchip.com/downloads/en/DeviceDoc/20002276C.pdf
pins: 1 GND, 2 VO, 3 VI

## MCP1754S-1802xMB
designator *  value MCP1754S-1802xMB  Reference: U
ki_keywords: Regulator LDO; ki_description: Fixed 150mA Low Dropout Voltage Regulator, Positive, 1.8V output, SOT-89; ki_fp_filters: SOT?89*; Footprint: Package_TO_SOT_SMD:SOT-89-3; Datasheet: http://ww1.microchip.com/downloads/en/DeviceDoc/20002276C.pdf
pins: 1 VI, 2 GND, 3 VO

## MCP1754S-3302xCB
designator *  value MCP1754S-3302xCB  Reference: U
ki_keywords: Regulator LDO; ki_description: Fixed 150mA Low Dropout Voltage Regulator, Positive, 3.3V output, SOT-23; ki_fp_filters: SOT?23*; Footprint: Package_TO_SOT_SMD:SOT-23; Datasheet: http://ww1.microchip.com/downloads/en/DeviceDoc/20002276C.pdf
pins: 1 GND, 2 VO, 3 VI

## MCP1754S-3302xMB
designator *  value MCP1754S-3302xMB  Reference: U
ki_keywords: Regulator LDO; ki_description: Fixed 150mA Low Dropout Voltage Regulator, Positive, 3.3V output, SOT-89; ki_fp_filters: SOT?89*; Footprint: Package_TO_SOT_SMD:SOT-89-3; Datasheet: http://ww1.microchip.com/downloads/en/DeviceDoc/20002276C.pdf
pins: 1 VI, 2 GND, 3 VO

## MCP1754S-5002xCB
designator *  value MCP1754S-5002xCB  Reference: U
ki_keywords: Regulator LDO; ki_description: Fixed 150mA Low Dropout Voltage Regulator, Positive, 5V output, SOT-23; ki_fp_filters: SOT?23*; Footprint: Package_TO_SOT_SMD:SOT-23; Datasheet: http://ww1.microchip.com/downloads/en/DeviceDoc/20002276C.pdf
pins: 1 GND, 2 VO, 3 VI

## MCP1754S-5002xMB
designator *  value MCP1754S-5002xMB  Reference: U
ki_keywords: Regulator LDO; ki_description: Fixed 150mA Low Dropout Voltage Regulator, Positive, 5V output, SOT-89; ki_fp_filters: SOT?89*; Footprint: Package_TO_SOT_SMD:SOT-89-3; Datasheet: http://ww1.microchip.com/downloads/en/DeviceDoc/20002276C.pdf
pins: 1 VI, 2 GND, 3 VO

## MCP1792x-3302xCB
designator *  value MCP1792x-3302xCB  Reference: U
ki_keywords: regulator linear ldo; ki_description: 100mA Low Quiscent Current LDO, 4.5-55V input, 3.3V output, SOT-23; ki_fp_filters: SOT?23*; Footprint: Package_TO_SOT_SMD:SOT-23; Datasheet: https://ww1.microchip.com/downloads/aemDocuments/documents/APID/ProductDocuments/DataSheets/MCP1792-Family-Data-Sheet-DS20006229D.pdf
pins: 1 GND, 2 VO, 3 VI

## MCP1792x-3302xDB
designator *  value MCP1792x-3302xDB  Reference: U
ki_keywords: REGULATOR LDO; ki_description: Low Quiescent Current LDO Regulator, 4.5-55V input, 3.3V, 100mA, SOT-223; ki_fp_filters: SOT?223*TabPin2*; Footprint: Package_TO_SOT_SMD:SOT-223-3_TabPin2; Datasheet: https://ww1.microchip.com/downloads/aemDocuments/documents/APID/ProductDocuments/DataSheets/MCP1792-Family-Data-Sheet-DS20006229D.pdf
pins: 1 VI, 2 GND, 3 VO

## MCP1792x-4102xCB
designator *  value MCP1792x-4102xCB  Reference: U
ki_keywords: regulator linear ldo; ki_description: 100mA Low Quiscent Current LDO, 4.5-55V input, 4.1V output, SOT-23; ki_fp_filters: SOT?23*; Footprint: Package_TO_SOT_SMD:SOT-23; Datasheet: https://ww1.microchip.com/downloads/aemDocuments/documents/APID/ProductDocuments/DataSheets/MCP1792-Family-Data-Sheet-DS20006229D.pdf
pins: 1 GND, 2 VO, 3 VI

## MCP1792x-4102xDB
designator *  value MCP1792x-4102xDB  Reference: U
ki_keywords: REGULATOR LDO; ki_description: Low Quiescent Current LDO Regulator, 4.5-55V input, 4.1V, 100mA, SOT-223; ki_fp_filters: SOT?223*TabPin2*; Footprint: Package_TO_SOT_SMD:SOT-223-3_TabPin2; Datasheet: https://ww1.microchip.com/downloads/aemDocuments/documents/APID/ProductDocuments/DataSheets/MCP1792-Family-Data-Sheet-DS20006229D.pdf
pins: 1 VI, 2 GND, 3 VO

## MCP1792x-5002xCB
designator *  value MCP1792x-5002xCB  Reference: U
ki_keywords: regulator linear ldo; ki_description: 100mA Low Quiscent Current LDO, 4.5-55V input, 5.0V output, SOT-23; ki_fp_filters: SOT?23*; Footprint: Package_TO_SOT_SMD:SOT-23; Datasheet: https://ww1.microchip.com/downloads/aemDocuments/documents/APID/ProductDocuments/DataSheets/MCP1792-Family-Data-Sheet-DS20006229D.pdf
pins: 1 GND, 2 VO, 3 VI

## MCP1792x-5002xDB
designator *  value MCP1792x-5002xDB  Reference: U
ki_keywords: REGULATOR LDO; ki_description: Low Quiescent Current LDO Regulator, 4.5-55V input, 5.0V, 100mA, SOT-223; ki_fp_filters: SOT?223*TabPin2*; Footprint: Package_TO_SOT_SMD:SOT-223-3_TabPin2; Datasheet: https://ww1.microchip.com/downloads/aemDocuments/documents/APID/ProductDocuments/DataSheets/MCP1792-Family-Data-Sheet-DS20006229D.pdf
pins: 1 VI, 2 GND, 3 VO

## MCP1799x-330xxTT
designator *  value MCP1799x-330xxTT  Reference: U
ki_keywords: regulator linear ldo; ki_description: 80 mA High-Voltage Automotive LDO, 3.3V output, SOT-23; ki_fp_filters: SOT?23*; Footprint: Package_TO_SOT_SMD:SOT-23; Datasheet: https://ww1.microchip.com/downloads/en/DeviceDoc/MCP1799-Data-Sheet-20006248A.pdf
pins: 1 GND, 2 VO, 3 VI

## MCP1799x-500xxTT
designator *  value MCP1799x-500xxTT  Reference: U
ki_keywords: regulator linear ldo; ki_description: 80 mA High-Voltage Automotive LDO, 5V output, SOT-23; ki_fp_filters: SOT?23*; Footprint: Package_TO_SOT_SMD:SOT-23; Datasheet: https://ww1.microchip.com/downloads/en/DeviceDoc/MCP1799-Data-Sheet-20006248A.pdf
pins: 1 GND, 2 VO, 3 VI

## MCP1802x-xx02xOT
designator *  value MCP1802x-xx02xOT  Reference: U
ki_keywords: LDO Linear Voltage Regulator; ki_description: 150mA, Tiny CMOS LDO With Shutdown, Fixed Voltage, SOT-23-5; ki_fp_filters: SOT?23*; Footprint: Package_TO_SOT_SMD:SOT-23-5; Datasheet: http://ww1.microchip.com/downloads/en/DeviceDoc/22053C.pdf
pins: 1 VIN, 2 GND, 3 ~{{SHDN}}, 4 NC hidden, 5 VOUT
